# Altium footprint library Pi.PcbLib: 61 footprints (part 1 of 4)
Each footprint in its own frame and in the unit in brackets; x right, y up, seen from the top. Pads: shape width x height; smd on the part's side, far side on the other; paste and mask are expansions set on the pad; w line width, h text height; cw(c..) or ccw(c..) is an arc to the next point about the centre after c.
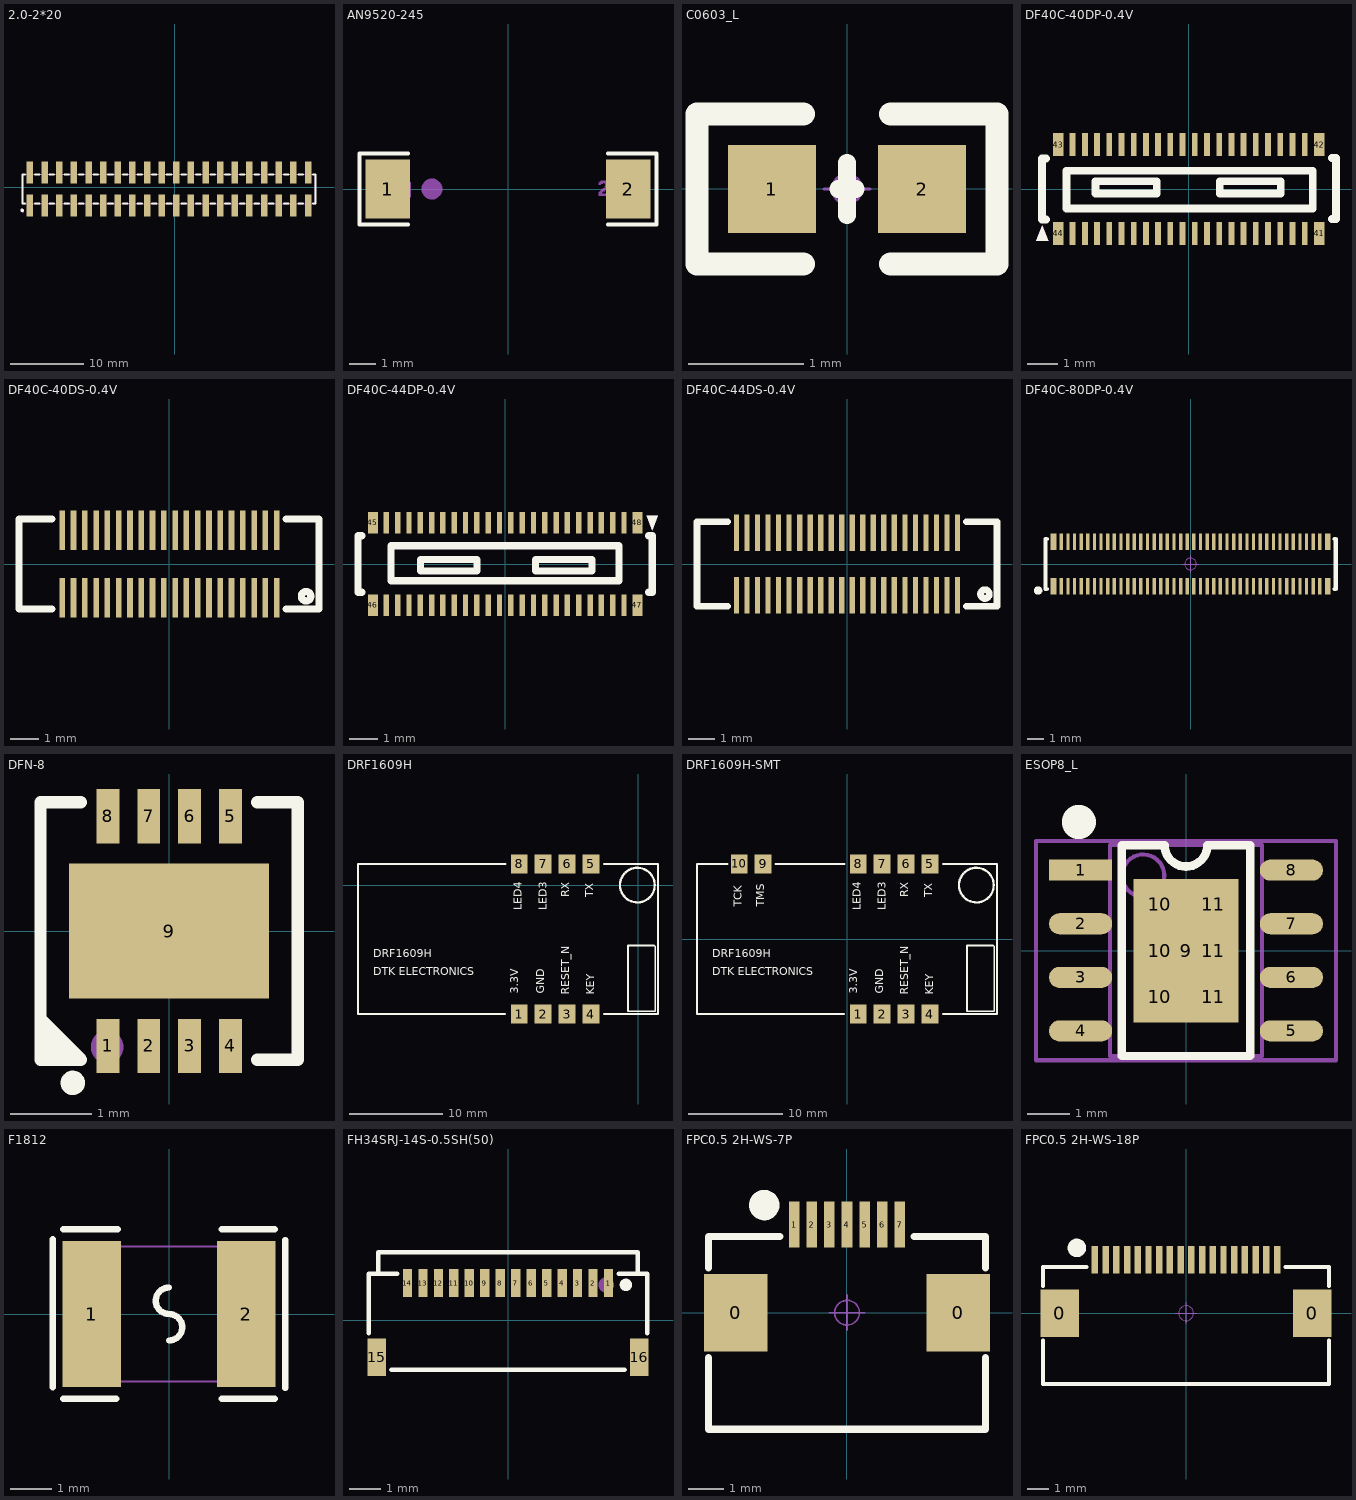
[diagram p0: the footprints below, top view; thin cyan lines are the x and y axes]

## 2.0-2*20 [mm]
pads (40):
  rect 0.89x3 smd mask+0.051: 1(-19.762,-2.462) 2(-19.762,2.037) 3(-17.762,-2.462) 4(-17.762,2.037) 5(-15.762,-2.462) 6(-15.762,2.037) 7(-13.762,-2.462) 8(-13.762,2.037) 9(-11.762,-2.462) 10(-11.762,2.037) 11(-9.762,-2.462) 12(-9.762,2.037) 13(-7.762,-2.462) 14(-7.762,2.037) 15(-5.762,-2.462) 16(-5.762,2.037) 17(-3.762,-2.462) 18(-3.762,2.037) 19(-1.762,-2.462) 20(-1.762,2.037) 21(0.238,-2.462) 22(0.238,2.037) 23(2.238,-2.462) 24(2.238,2.037) 25(4.238,-2.462) 26(4.238,2.037) 27(6.238,-2.462) 28(6.238,2.037) 29(8.238,-2.462) 30(8.238,2.037) 31(10.238,-2.462) 32(10.238,2.037) 33(12.238,-2.462) 34(12.238,2.037) 35(14.238,-2.462) 36(14.238,2.037) 37(16.238,-2.462) 38(16.238,2.037) 39(18.238,-2.462) 40(18.238,2.037)
Top Overlay:
  circle w0.254: c-20.828,-3.133 r0.127
  lines w0.254: -20.438,-2.212 -20.762,-2.212 -20.762,-0.212 -20.762,1.788 -20.438,1.788 ; -19.086,-2.212 -18.438,-2.212 ; -19.086,1.788 -18.438,1.788 ; -17.086,-2.212 -16.438,-2.212 ; -17.086,1.788 -16.438,1.788 ; -15.086,-2.212 -14.438,-2.212 ; -15.086,1.788 -14.438,1.788 ; -13.086,-2.212 -12.438,-2.212 ; -13.086,1.788 -12.438,1.788 ; -11.086,-2.212 -10.438,-2.212 ; -11.086,1.788 -10.438,1.788 ; -9.086,-2.212 -8.438,-2.212 ; -9.086,1.788 -8.438,1.788 ; -7.086,-2.212 -6.438,-2.212 ; -7.086,1.788 -6.438,1.788 ; -5.086,-2.212 -4.438,-2.212 ; -5.086,1.788 -4.438,1.788 ; -3.086,-2.212 -2.438,-2.212 ; -3.086,1.788 -2.438,1.788 ; -1.086,-2.212 -0.438,-2.212 ; -1.086,1.788 -0.438,1.788 ; 0.914,-2.212 1.562,-2.212 ; 0.914,1.788 1.562,1.788 ; 2.914,-2.212 3.562,-2.212 ; 2.914,1.788 3.562,1.788 ; 4.914,-2.212 5.562,-2.212 ; 4.914,1.788 5.562,1.788 ; 6.914,-2.212 7.562,-2.212 ; 6.914,1.788 7.562,1.788 ; 8.914,-2.212 9.562,-2.212 ; 8.914,1.788 9.562,1.788 ; 10.914,-2.212 11.562,-2.212 ; 10.914,1.788 11.562,1.788 ; 12.914,-2.212 13.562,-2.212 ; 12.914,1.788 13.562,1.788 ; 14.914,-2.212 15.562,-2.212 ; 14.914,1.788 15.562,1.788 ; 16.914,-2.212 17.562,-2.212 ; 16.914,1.788 17.562,1.788 ; 18.914,-2.212 19.238,-2.212 19.238,-0.212 19.238,1.788 18.914,1.788
Mechanical 15:
  drawing of 45 lines, arcs and shapes, not listed

## AN9520-245 [mm]
pads (2):
  rect 1.71x2.268 smd: 1(-4.63,0) 2(4.63,0)
Top Overlay:
  lines w0.152: -3.851,-1.363 -5.714,-1.363 -5.714,1.363 -3.851,1.363 ; 3.851,-1.363 5.714,-1.363 5.714,1.363 3.851,1.363
Top Paste:
  region: -3.775,-1.034 -3.775,-0.486 -3.875,-0.386 -4.256,-0.386 -4.356,-0.286 -4.356,0.286 -4.256,0.386 -3.875,0.386 -3.775,0.486 -3.775,1.034 -3.875,1.134 -5.385,1.134 -5.485,1.034 -5.485,-1.034 -5.385,-1.134 -3.875,-1.134
  region: 3.775,-1.034 3.775,-0.486 3.875,-0.386 4.256,-0.386 4.356,-0.286 4.356,0.286 4.256,0.386 3.875,0.386 3.775,0.486 3.775,1.034 3.875,1.134 5.385,1.134 5.485,1.034 5.485,-1.034 5.385,-1.134 3.875,-1.134
Mechanical 15:
  circle w0.4: c-2.921,0 r0.2
  region: 3.492,-0.117 3.528,-0.117 3.528,-0.261 3.492,-0.261
  region: 3.492,0.243 3.528,0.243 3.528,0.171 3.492,0.171
  region: 3.528,-0.081 3.564,-0.081 3.564,-0.261 3.528,-0.261
  region: 3.528,0.279 3.564,0.279 3.564,0.171 3.528,0.171
  region: 3.564,-0.045 3.6,-0.045 3.6,-0.261 3.564,-0.261
  region: 3.564,0.315 3.6,0.315 3.6,0.207 3.564,0.207
  region: 3.6,-0.189 3.636,-0.189 3.636,-0.261 3.6,-0.261
  region: 3.6,-0.009 3.636,-0.009 3.636,-0.117 3.6,-0.117
  region: 3.6,0.315 3.636,0.315 3.636,0.207 3.6,0.207
  region: 3.636,-0.189 3.672,-0.189 3.672,-0.261 3.636,-0.261
  region: 3.636,0.027 3.672,0.027 3.672,-0.081 3.636,-0.081
  region: 3.636,0.315 3.672,0.315 3.672,0.243 3.636,0.243
  region: 3.672,-0.189 3.708,-0.189 3.708,-0.261 3.672,-0.261
  region: 3.672,0.027 3.708,0.027 3.708,-0.081 3.672,-0.081
  region: 3.672,0.315 3.708,0.315 3.708,0.243 3.672,0.243
  region: 3.708,-0.189 3.744,-0.189 3.744,-0.261 3.708,-0.261
  region: 3.708,0.099 3.744,0.099 3.744,-0.045 3.708,-0.045
  region: 3.708,0.315 3.744,0.315 3.744,0.207 3.708,0.207
  region: 3.744,-0.189 3.78,-0.189 3.78,-0.261 3.744,-0.261
  region: 3.744,0.315 3.78,0.315 3.78,-0.009 3.744,-0.009
  region: 3.78,-0.189 3.816,-0.189 3.816,-0.261 3.78,-0.261
  region: 3.78,0.279 3.816,0.279 3.816,-0.009 3.78,-0.009
  region: 3.816,-0.189 3.852,-0.189 3.852,-0.261 3.816,-0.261
  region: 3.816,0.279 3.852,0.279 3.852,0.063 3.816,0.063
  region: 3.852,-0.189 3.888,-0.189 3.888,-0.261 3.852,-0.261
  region: -4.034,0.158 -3.998,0.158 -3.998,0.086 -4.034,0.086
  region: -3.998,0.158 -3.962,0.158 -3.962,0.086 -3.998,0.086
  region: -3.962,0.194 -3.926,0.194 -3.926,0.086 -3.962,0.086
  region: -3.926,0.23 -3.89,0.23 -3.89,0.122 -3.926,0.122
  region: -3.89,0.23 -3.854,0.23 -3.854,-0.31 -3.89,-0.31
  region: -3.854,0.266 -3.818,0.266 -3.818,-0.31 -3.854,-0.31
  region: -3.818,0.266 -3.782,0.266 -3.782,-0.31 -3.818,-0.31
  region: -3.782,0.266 -3.746,0.266 -3.746,-0.31 -3.782,-0.31
3D body "AN9520-245.STEP": height 1, standoff 0, extent -4.775,-1.033 4.724,1.067

## C0603_L [mil] "无极性贴片电容"
pads (2):
  rect 30x30 smd: 1(-25.59,0) 2(25.59,0)
Top Overlay:
  lines w6: -3,0 0,0 3,0 ; 0,-9 0,9
  lines w8: -15,-25.59 -51.18,-25.59 -51.18,25.59 -15,25.59 ; 15,-25.59 51.18,-25.59 51.18,25.59 15,25.59
Mechanical 15:
  circle w1: c0,0 r5
  lines w1: -7.87,0 7.87,0 ; 0,-7.87 0,7.87
3D body "C 0603.STEP": height 32.89, standoff 0.61, extent -31.49,-16.14 31.5,16.14

## DF40C-40DP-0.4V [mm]
pads (44):
  rect 0.19x0.75 smd: 1(-3.8,-1.455) 2(-3.8,1.455) 3(-3.4,-1.455) 4(-3.4,1.455) 5(-3,-1.455) 6(-3,1.455) 7(-2.6,-1.455) 8(-2.6,1.455) 9(-2.2,-1.455) 10(-2.2,1.455) 11(-1.8,-1.455) 12(-1.8,1.455) 13(-1.4,-1.455) 14(-1.4,1.455) 15(-1,-1.455) 16(-1,1.455) 17(-0.6,-1.455) 18(-0.6,1.455) 19(-0.2,-1.455) 20(-0.2,1.455) 21(0.2,-1.455) 22(0.2,1.455) 23(0.6,-1.455) 24(0.6,1.455) 25(1,-1.455) 26(1,1.455) 27(1.4,-1.455) 28(1.4,1.455) 29(1.8,-1.455) 30(1.8,1.455) 31(2.2,-1.455) 32(2.2,1.455) 33(2.6,-1.455) 34(2.6,1.455) 35(3,-1.455) 36(3,1.455) 37(3.4,-1.455) 38(3.4,1.455) 39(3.8,-1.455) 40(3.8,1.455)
  rect 0.35x0.75 smd: 41(4.275,-1.455) 42(4.275,1.455) 43(-4.275,1.455) 44(-4.275,-1.455)
Top Overlay:
  region: -5,-1.7 -4.6,-1.7 -4.8,-1.2
  lines w0.254: -4.67,-1 -4.8,-1 -4.8,1 -4.67,1 ; 4.696,-0.984 4.826,-0.984 4.826,1.016 4.696,1.016 ; -4,-0.635 4.064,-0.635 4.064,0.6 -4,0.6 -4,-0.635 ; -3.048,-0.146 -1.048,-0.146 -1.048,0.254 -3.048,0.254 -3.048,-0.146 ; 1.016,-0.146 3.016,-0.146 3.016,0.254 1.016,0.254 1.016,-0.146
Mechanical 15:
  region: -4.8,-1.19 -4.8,-1.5 -5,-1.7 -4.6,-1.7
  region: -4.8,-1.19 -4.8,-1.5 -5,-1.7
3D body "DF37NB-40DS-0_4V.STEP": height 0.92, standoff -0.06, extent -5.112,-1.44 5.108,1.54

## DF40C-40DS-0.4V [mm]
pads (40):
  rect 0.2x1.4 smd: 1(3.8,-1.19) 2(3.8,1.19) 3(3.4,-1.19) 4(3.4,1.19) 5(3,-1.19) 6(3,1.19) 7(2.6,-1.19) 8(2.6,1.19) 9(2.2,-1.19) 10(2.2,1.19) 11(1.8,-1.19) 12(1.8,1.19) 13(1.4,-1.19) 14(1.4,1.19) 15(1,-1.19) 16(1,1.19) 17(0.6,-1.19) 18(0.6,1.19) 19(0.2,-1.19) 20(0.2,1.19) 21(-0.2,-1.19) 22(-0.2,1.19) 23(-0.6,-1.19) 24(-0.6,1.19) 25(-1,-1.19) 26(-1,1.19) 27(-1.4,-1.19) 28(-1.4,1.19) 29(-1.8,-1.19) 30(-1.8,1.19) 31(-2.2,-1.19) 32(-2.2,1.19) 33(-2.6,-1.19) 34(-2.6,1.19) 35(-3,-1.19) 36(-3,1.19) 37(-3.4,-1.19) 38(-3.4,1.19) 39(-3.8,-1.19) 40(-3.8,1.19)
Top Overlay:
  circle w0.254: c4.842,-1.143 r0.168
  lines w0.254: -4.165,-1.6 -5.334,-1.6 -5.334,0 -5.334,1.6 -4.165,1.6 ; 4.131,-1.6 5.3,-1.6 5.3,0 5.3,1.6 4.131,1.6
3D body "DF37NB-40DS-0_4V.STEP": height 1.02, standoff 0.04, extent -5.105,-1.465 5.115,1.515

## DF40C-44DP-0.4V [mm]
pads (48):
  rect 0.19x0.75 smd: 1(4.2,1.455) 2(4.2,-1.455) 3(3.8,1.455) 4(3.8,-1.455) 5(3.4,1.455) 6(3.4,-1.455) 7(3,1.455) 8(3,-1.455) 9(2.6,1.455) 10(2.6,-1.455) 11(2.2,1.455) 12(2.2,-1.455) 13(1.8,1.455) 14(1.8,-1.455) 15(1.4,1.455) 16(1.4,-1.455) 17(1,1.455) 18(1,-1.455) 19(0.6,1.455) 20(0.6,-1.455) 21(0.2,1.455) 22(0.2,-1.455) 23(-0.2,1.455) 24(-0.2,-1.455) 25(-0.6,1.455) 26(-0.6,-1.455) 27(-1,1.455) 28(-1,-1.455) 29(-1.4,1.455) 30(-1.4,-1.455) 31(-1.8,1.455) 32(-1.8,-1.455) 33(-2.2,1.455) 34(-2.2,-1.455) 35(-2.6,1.455) 36(-2.6,-1.455) 37(-3,1.455) 38(-3,-1.455) 39(-3.4,1.455) 40(-3.4,-1.455) 41(-3.8,1.455) 42(-3.8,-1.455) 43(-4.2,1.455) 44(-4.2,-1.455)
  rect 0.35x0.75 smd: 45(-4.675,1.455) 46(-4.675,-1.455) 47(4.675,-1.455) 48(4.675,1.455)
Top Overlay:
  region: 5.4,1.7 5,1.7 5.2,1.2
  lines w0.254: -5.07,-1 -5.2,-1 -5.2,1 -5.07,1 ; 5.07,-1 5.2,-1 5.2,1 5.07,1 ; -4.039,-0.592 4.025,-0.592 4.025,0.643 -4.039,0.643 -4.039,-0.592 ; -2.991,-0.246 -0.991,-0.246 -0.991,0.154 -2.991,0.154 -2.991,-0.246 ; 1.073,-0.246 3.073,-0.246 3.073,0.154 1.073,0.154 1.073,-0.246
Mechanical 15:
  region: 5.2,1.19 5.2,1.5 5.4,1.7 5,1.7
  region: 5.2,1.19 5.2,1.5 5.4,1.7
3D body "DF40C-44DP.SLDPRT": height 1.14, standoff 0, extent -5.164,-1.485 5.156,1.485

## DF40C-44DS-0.4V [mm]
pads (44):
  rect 0.2x1.4 smd: 1(4.2,-1.19) 2(4.2,1.19) 3(3.8,-1.19) 4(3.8,1.19) 5(3.4,-1.19) 6(3.4,1.19) 7(3,-1.19) 8(3,1.19) 9(2.6,-1.19) 10(2.6,1.19) 11(2.2,-1.19) 12(2.2,1.19) 13(1.8,-1.19) 14(1.8,1.19) 15(1.4,-1.19) 16(1.4,1.19) 17(1,-1.19) 18(1,1.19) 19(0.6,-1.19) 20(0.6,1.19) 21(0.2,-1.19) 22(0.2,1.19) 23(-0.2,-1.19) 24(-0.2,1.19) 25(-0.6,-1.19) 26(-0.6,1.19) 27(-1,-1.19) 28(-1,1.19) 29(-1.4,-1.19) 30(-1.4,1.19) 31(-1.8,-1.19) 32(-1.8,1.19) 33(-2.2,-1.19) 34(-2.2,1.19) 35(-2.6,-1.19) 36(-2.6,1.19) 37(-3,-1.19) 38(-3,1.19) 39(-3.4,-1.19) 40(-3.4,1.19) 41(-3.8,-1.19) 42(-3.8,1.19) 43(-4.2,-1.19) 44(-4.2,1.19)
Top Overlay:
  circle w0.254: c5.242,-1.143 r0.168
  lines w0.254: -4.531,-1.6 -5.7,-1.6 -5.7,0 -5.7,1.6 -4.531,1.6 ; 4.531,-1.6 5.7,-1.6 5.7,0 5.7,1.6 4.531,1.6

## DF40C-80DP-0.4V [mm]
pads (84):
  rect 0.2x1 smd: 1(-7.8,-1.355) 2(-7.4,-1.355) 3(-7,-1.355) 4(-6.6,-1.355) 5(-6.2,-1.355) 6(-5.8,-1.355) 7(-5.4,-1.355) 8(-5,-1.355) 9(-4.6,-1.355) 10(-4.2,-1.355) 11(-3.8,-1.355) 12(-3.4,-1.355) 13(-3,-1.355) 14(-2.6,-1.355) 15(-2.2,-1.355) 16(-1.8,-1.355) 17(-1.4,-1.355) 18(-1,-1.355) 19(-0.6,-1.355) 20(-0.2,-1.355) 21(0.2,-1.355) 22(0.6,-1.355) 23(1,-1.355) 24(1.4,-1.355) 25(1.8,-1.355) 26(2.2,-1.355) 27(2.6,-1.355) 28(3,-1.355) 29(3.4,-1.355) 30(3.8,-1.355) 31(4.2,-1.355) 32(4.6,-1.355) 33(5,-1.355) 34(5.4,-1.355) 35(5.8,-1.355) 36(6.2,-1.355) 37(6.6,-1.355) 38(7,-1.355) 39(7.4,-1.355) 40(7.8,-1.355) 41(7.8,1.355) 42(7.4,1.355) 43(7,1.355) 44(6.6,1.355) 45(6.2,1.355) 46(5.8,1.355) 47(5.4,1.355) 48(5,1.355) 49(4.6,1.355) 50(4.2,1.355) 51(3.8,1.355) 52(3.4,1.355) 53(3,1.355) 54(2.6,1.355) 55(2.2,1.355) 56(1.8,1.355) 57(1.4,1.355) 58(1,1.355) 59(0.6,1.355) 60(0.2,1.355) 61(-0.2,1.355) 62(-0.6,1.355) 63(-1,1.355) 64(-1.4,1.355) 65(-1.8,1.355) 66(-2.2,1.355) 67(-2.6,1.355) 68(-3,1.355) 69(-3.4,1.355) 70(-3.8,1.355) 71(-4.2,1.355) 72(-4.6,1.355) 73(-5,1.355) 74(-5.4,1.355) 75(-5.8,1.355) 76(-6.2,1.355) 77(-6.6,1.355) 78(-7,1.355) 79(-7.4,1.355) 80(-7.8,1.355)
  rect 0.35x1 smd: 81(-8.275,1.355) 82(-8.275,-1.355) 83(8.275,-1.355) 84(8.275,1.355)
Top Overlay:
  circle w0.254: c-9.2,-1.6 r0.127
  lines w0.254: -8.681,-1.5 -8.76,-1.5 -8.76,1.5 -8.681,1.5 ; 8.681,-1.5 8.76,-1.5 8.76,1.5 8.681,1.5
Mechanical 15:
  circle w0.05: c0,0 r0.35
  lines w0.05: -0.5,0 0.5,0 ; 0,-0.5 0,0.5

## DFN-8 [mm]
pads (9):
  rect 0.28x0.665 smd: 1(-0.75,-1.407) 2(-0.25,-1.407) 3(0.25,-1.407) 4(0.75,-1.407) 5(0.75,1.407) 6(0.25,1.407) 7(-0.25,1.407) 8(-0.75,1.407)
  rect 2.45x1.65 smd: 9(0,0)
Top Overlay:
  circle w0.15: c-1.18,-1.86 r0.075
  region: -1.08,-1.576 -1.576,-1.576 -1.58,-1.08
  lines w0.152: -1.576,-1.079 -1.08,-1.575 -1.08,-1.576 -1.576,-1.576 -1.576,1.576 -1.08,1.576 ; 1.08,-1.576 1.576,-1.576 1.576,1.576 1.08,1.576
Mechanical 15:
  circle w0.2: c-0.76,-1.42 r0.1
3D body "DFN-8.STEP": height 0.8, standoff 0, extent -1.5,-1.51 1.5,1.51

## DRF1609H [mm]
pads (8):
  rect 1.8x2 smd: 1(-12.7,-13.716) 2(-10.15,-13.716) 3(-7.6,-13.716) 4(-5.05,-13.716) 5(-5.05,2.284) 6(-7.6,2.284) 7(-10.15,2.284) 8(-12.7,2.284)
Top Overlay:
  circle w0.25: c-0.101,0.034 r1.851
  lines w0.2: -21.55,2.284 -14.15,2.284 ; -21.463,2.284 -29.9,2.284 -29.9,-13.716 -16.6,-13.716 -14.225,-13.716 ; -3.65,-13.716 2.1,-13.716 2.1,2.284 -3.65,2.284 ; -1.1,-6.516 -1.1,-13.416 1.8,-13.416 1.8,-6.516 ; -1.1,-6.416 1.7,-6.416
  text "LED4" at -12.122,-2.668 h1.5
  text "LED3" at -9.455,-2.668 h1.5
  text "RX" at -7.042,-1.271 h1.5
  text "TX" at -4.502,-1.271 h1.5
  text "KEY" at -4.375,-11.685 h1.5
  text "RESET_N" at -7.042,-11.685 h1.5
  text "GND" at -9.709,-11.558 h1.5
  text "3.3V" at -12.503,-11.558 h1.5
  text "DRF1609H" at -28.251,-8.002 h1.5
  text "DTK ELECTRONICS" at -28.251,-9.907 h1.5

## DRF1609H-SMT [mm]
height 3
pads (10):
  rect 1.8x2 smd: 1(1.2,-8) 2(3.75,-8) 3(6.3,-8) 4(8.85,-8) 5(8.85,8) 6(6.3,8) 7(3.75,8) 8(1.2,8) 9(-8.95,8) 10(-11.5,8)
Top Overlay:
  circle w0.25: c13.799,5.75 r1.851
  lines w0.2: -12.75,8 -16,8 -16,-8 -2.7,-8 -0.325,-8 ; -7.65,8 -0.25,8 ; 10.25,-8 16,-8 16,8 10.25,8 ; 12.8,-0.8 12.8,-7.7 15.7,-7.7 15.7,-0.8 ; 12.8,-0.7 15.6,-0.7
  text "TCK" at -10.922,3.429 h1.5
  text "TMS" at -8.509,3.429 h1.5
  text "LED4" at 1.778,3.048 h1.5
  text "LED3" at 4.445,3.048 h1.5
  text "RX" at 6.858,4.445 h1.5
  text "TX" at 9.398,4.445 h1.5
  text "KEY" at 9.525,-5.969 h1.5
  text "RESET_N" at 6.858,-5.969 h1.5
  text "GND" at 4.191,-5.842 h1.5
  text "3.3V" at 1.397,-5.842 h1.5
  text "DRF1609H" at -14.351,-2.286 h1.5
  text "DTK ELECTRONICS" at -14.351,-4.191 h1.5

## ESOP8_L [mm] "5*6*1.8mm（长宽高）"
height 1.75
pads (15):
  rect 1.5x0.5 smd: 1(-2.5,1.905)
  oval 1.5x0.5 smd: 2(-2.5,0.635) 3(-2.5,-0.635) 4(-2.5,-1.905) 5(2.5,-1.905) 6(2.5,-0.635) 7(2.5,0.635) 8(2.5,1.905)
  rect 2.5x3.4 smd paste-2: 9(0,0)
  rect 0.9x0.7 on Top Paste: 10(-0.625,-1.1) 10(-0.625,0) 10(-0.625,1.1) 11(0.65,-1.1) 11(0.65,0) 11(0.65,1.1)
Top Overlay:
  circle w0.5: c-2.54,3.048 r0.155
  lines w0.2: -1.524,2.5 -1.524,-2.5 1.524,-2.5 1.524,2.5
  lines w0.203: -1.524,2.5 -0.508,2.5 ccw(c0,2.5) 0,1.992 ccw(c0,2.5) 0.508,2.5 1.524,2.5
Mechanical 13:
  circle w0.1: c-1.016,1.778 r0.5
  lines w0.1: -1.8,-2.5 -1.8,2.5 1.8,2.5 1.8,-2.5 -1.8,-2.5
Mechanical 15:
  circle w0.05: c0,0 r0.35
  lines w0.05: -0.5,0 0.5,0 ; 0,-0.5 0,0.5
  lines w0.1: -3.556,-2.6 -3.556,2.6 3.556,2.6 3.556,-2.6 -3.556,-2.6
3D body "ESOP8.STEP": height -0.45, standoff -1.99, extent -3.003,-2.5 3.003,2.5

## F1812 [mm]
pads (2):
  rect 1.407x3.499 smd mask+0.051: 1(-1.853,0) 2(1.853,0)
Top Overlay:
  lines w0.152: -2.794,-1.758 -2.794,1.798 ; -2.54,-2.032 -1.27,-2.032 ; -2.54,2.032 -1.235,2.032 ; 0,-0.635 ccw(c0,-0.318) 0,0 cw(c0,0.318) 0,0.635 ; 1.27,-2.032 2.54,-2.032 ; 1.27,2.032 2.54,2.032 ; 2.794,-1.778 2.794,1.778
Top Paste:
  region: 1.15,-1.65 1.15,-0.695 1.25,-0.595 1.528,-0.595 1.628,-0.495 1.628,0.495 1.528,0.595 1.25,0.595 1.15,0.695 1.15,1.65 1.25,1.75 2.457,1.75 2.557,1.65 2.557,-1.65 2.457,-1.75 1.25,-1.75
  region: -1.15,-1.65 -1.15,-0.695 -1.25,-0.595 -1.528,-0.595 -1.628,-0.495 -1.628,0.495 -1.528,0.595 -1.25,0.595 -1.15,0.695 -1.15,1.65 -1.25,1.75 -2.457,1.75 -2.557,1.65 -2.557,-1.65 -2.457,-1.75 -1.25,-1.75
Mechanical 15:
  region: -2.215,-1.62 -2.215,-1.595 -2.25,-1.56 -2.3,-1.56 -2.335,-1.595 -2.335,-1.62 -2.335,-1.645 -2.3,-1.68 -2.25,-1.68 -2.215,-1.645
  region: -2.275,-1.62 -2.275,1.62 -1.525,1.62 -1.525,-1.62
  region: 2.275,-1.62 2.275,1.62 1.525,1.62 1.525,-1.62
  lines w0.051: -2.275,-1.62 -2.275,1.62 2.275,1.62 2.275,-1.62 -2.275,-1.62
3D body "MF-MSMF110-16-2.STEP": height 1.09, standoff 0.05, extent -2.25,-1.62 2.25,1.58

## FH34SRJ-14S-0.5SH(50) [mm]
pads (16):
  rect 0.3x0.9 smd: 1(3.25,1.2) 2(2.75,1.2) 3(2.25,1.2) 4(1.75,1.2) 5(1.25,1.2) 6(0.75,1.2) 7(0.25,1.2) 8(-0.25,1.2) 9(-0.75,1.2) 10(-1.25,1.2) 11(-1.75,1.2) 12(-2.25,1.2) 13(-2.75,1.2) 14(-3.25,1.2)
  rect 0.6x1.2 smd: 15(-4.25,-1.2) 16(4.25,-1.2)
Top Overlay:
  circle w0.2: c3.81,1.143 r0.1
  lines w0.152: -4.5,-0.42 -4.5,1.5 -4.2,1.5 ; -3.77,-1.6 3.77,-1.6 ; -3.58,1.5 -4.2,1.5 ; 3.58,1.5 4.2,1.5 ; 4.5,-0.42 4.5,1.5 4.2,1.5 ; -4.2,1.5 -4.2,2.2 4.2,2.2 4.2,1.5
Mechanical 15:
  circle w0.25: c3.175,1.143 r0.125
3D body "FH34SRJ-14S-0.5SH(50).STEP": height 0.98, standoff -0.02, extent -4.475,-1.748 4.525,2.052

## FPC0.5 2H-WS-7P [mm]
pads (9):
  rect 1.8x2.2 smd: 0(-3.15,0) 0(3.15,0)
  rect 0.3x1.3 smd: 1(-1.5,2.497) 2(-1,2.497) 3(-0.5,2.497) 4(0,2.497) 5(0.5,2.497) 6(1,2.497) 7(1.5,2.497)
Top Overlay:
  circle w0.5: c-2.344,3.048 r0.18
  lines w0.2: -3.925,-1.27 -3.925,-3.302 3.925,-3.302 3.925,-1.27 ; -3.925,1.27 -3.925,2.159 -1.893,2.159 ; 1.893,2.159 3.925,2.159 3.925,1.27
Mechanical 15:
  circle w0.05: c0,0 r0.35
  lines w0.05: -0.5,0 0.5,0 ; 0,-0.5 0,0.5
3D body "FPC0.5_2H-S-W-7P.STEP": height 2, standoff -0.01, extent -3.85,-3.15 3.85,2.85

## FPC0.5 2H-WS-18P [mm]
pads (20):
  rect 1.8x2.2 smd: 0(-5.9,0) 0(5.9,0)
  rect 0.3x1.3 smd: 1(-4.25,2.497) 2(-3.75,2.497) 3(-3.25,2.497) 4(-2.75,2.497) 5(-2.25,2.497) 6(-1.75,2.497) 7(-1.25,2.497) 8(-0.75,2.497) 9(-0.25,2.497) 10(0.25,2.497) 11(0.75,2.497) 12(1.25,2.497) 13(1.75,2.497) 14(2.25,2.497) 15(2.75,2.497) 16(3.25,2.497) 17(3.75,2.497) 18(4.25,2.497)
Top Overlay:
  circle w0.5: c-5.094,3.048 r0.18
  lines w0.2: -6.675,-1.27 -6.675,-3.302 6.675,-3.302 6.675,-1.27 ; -6.675,1.27 -6.675,2.159 -4.643,2.159 ; 4.643,2.159 6.675,2.159 6.675,1.27
Mechanical 15:
  circle w0.05: c0,0 r0.35
  lines w0.05: -0.5,0 0.5,0 ; 0,-0.5 0,0.5
3D body "FPC0.5_2H-S-W-18P.STEP": height 2, standoff -0.01, extent -6.6,-3.15 6.6,2.85